# Altium footprint library stm32f103c8t6_module.PCBLIB: 1 footprints
Each footprint in its own frame and in the unit in brackets; x right, y up, seen from the top. Pads: shape width x height; smd on the part's side, far side on the other; paste and mask are expansions set on the pad; w line width, h text height; cw(c..) or ccw(c..) is an arc to the next point about the centre after c.
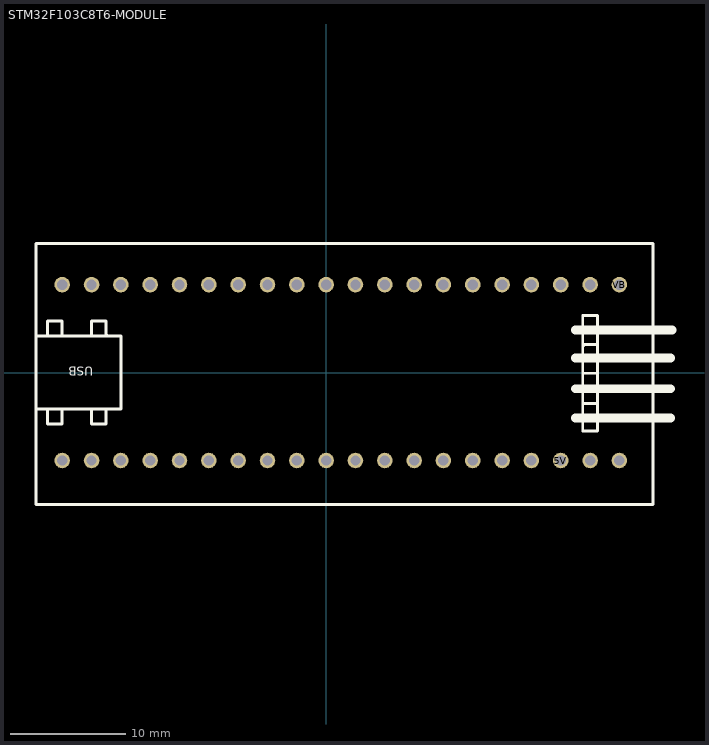
[diagram p0: the footprint, top view; thin cyan lines are the x and y axes]

## STM32F103C8T6-MODULE [mil]
pads (40):
  round 53.15 / inner round 60 / far side round 53.15 hole 35.43: 3.3V_1(1000,-300) 3.3V_2(-700,300) 5V(800,-300) GND_1(900,-300) GND_2(-800,300) GND_3(-900,300) PA_0(600,300) PA_1(500,300) PA_2(400,300) PA_3(300,300) PA_4(200,300) PA_5(100,300) PA_6(0,300) PA_7(-100,300) PA_8(-500,-300) PA_9(-400,-300) PA_10(-300,-300) PA_11(-200,-300) PA_12(-100,-300) PA_15(0,-300) PB_0(-200,300) PB_1(-300,300) PB_3(100,-300) PB_4(200,-300) PB_5(300,-300) PB_6(400,-300) PB_7(500,-300) PB_8(600,-300) PB_9(700,-300) PB_10(-400,300) PB_11(-500,300) PB_12(-900,-300) PB_13(-800,-300) PB_14(-700,-300) PB_15(-600,-300) PC_13(900,300) PC_14(800,300) PC_15(700,300) RESET(-600,300) VB(1000,300)
Top Overlay:
  lines w10: -990,-125 -700,-125 -700,125 -990,125 ; -950,-125 -950,-175 -900,-175 -900,-125 ; -950,125 -950,175 -900,175 -900,130 ; -800,-125 -800,-175 -750,-175 -750,-125 ; -800,125 -800,175 -750,175 -750,130 -745,125 ; 875,-105 925,-105 ; 875,-2.5 925,-2.5 ; 875,90 880,95 925,95 ; -990,-450 -990,440 1115,440 1115,-450 -990,-450 ; 875,-200 875,195 925,195 925,-200 875,-200
  lines w30: 850,-155 1175,-155 ; 850,-55 1175,-55 ; 850,50 1175,50 ; 850,145 1180,145
  text "USB" at -795,20 h30
3D body "YAAJ_BluePill.STEP": height 421.05, standoff -218.91, extent -991.3,-445 1115,440.83